# Altium footprint library 容阻感.PcbLib: 66 footprints (part 5 of 5)
Each footprint in its own frame and in the unit in brackets; x right, y up, seen from the top. Pads: shape width x height; smd on the part's side, far side on the other; paste and mask are expansions set on the pad; w line width, h text height; cw(c..) or ccw(c..) is an arc to the next point about the centre after c.
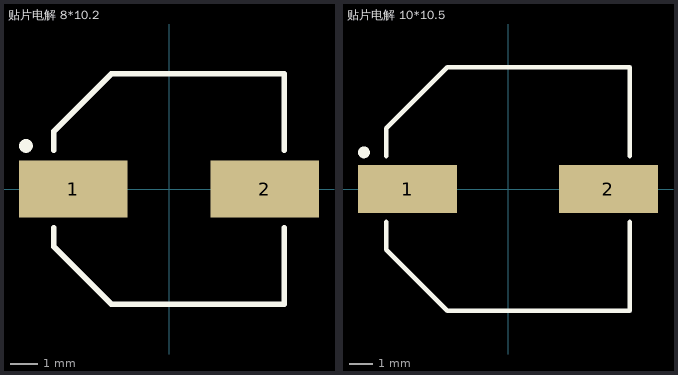
[diagram p4: the footprints below, top view; thin cyan lines are the x and y axes]

## 贴片电解 8*10.2 [mm]
pads (2):
  rect 3.9x2.05 smd: 1(-3.45,0) 2(3.45,0)
Top Overlay:
  circle w0.25: c-5.15,1.55 r0.125
  lines w0.2: -4.15,-1.4 -4.15,-2.075 -2.075,-4.15 4.15,-4.15 4.15,-1.4 ; -4.15,1.4 -4.15,2.075 -2.075,4.15 4.15,4.15 4.15,1.4
3D body "User Library-ALU-D.STEP": height 5.4, standoff 0, extent -3.5,-3.3 3.5,3.3

## 贴片电解 10*10.5 [mm]
pads (2):
  rect 4.2x2.05 smd: 1(-4.25,0) 2(4.25,0)
Top Overlay:
  circle w0.25: c-6.1,1.55 r0.125
  lines w0.2: -5.15,-1.4 -5.15,-2.575 -2.575,-5.15 5.15,-5.15 5.15,-1.4 ; -5.15,1.4 -5.15,2.575 -2.575,5.15 5.15,5.15 5.15,1.4
3D body "User Library-ALU-G.STEP": height 10.2, standoff 0, extent -5.8,-5.15 5.8,5.15